# Altium footprint library HDMI Connectors.PcbLib: 3 footprints
Each footprint in its own frame and in the unit in brackets; x right, y up, seen from the top. Pads: shape width x height; smd on the part's side, far side on the other; paste and mask are expansions set on the pad; w line width, h text height; cw(c..) or ccw(c..) is an arc to the next point about the centre after c.
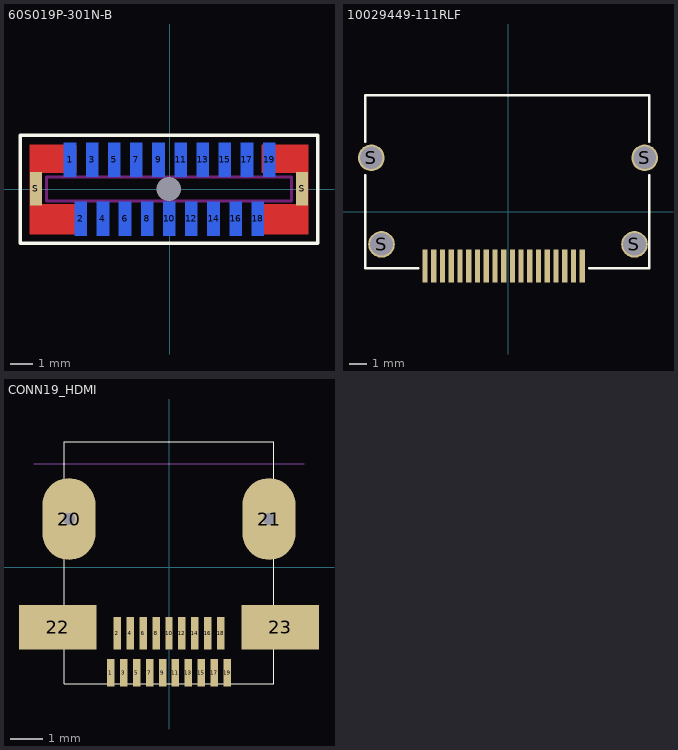
[diagram p0: the footprints below, top view; thin cyan lines are the x and y axes]

## 60S019P-301N-B [mm]
pads (22):
  rect 0x0 hole 1.1 square unplated: 0(-0.034,0.013)
  rect 0.55x1.524 smd far side: 1(-4.5,1.336) 2(-4.013,-1.336) 3(-3.5,1.336) 4(-3.013,-1.336) 5(-2.5,1.336) 6(-2.013,-1.336) 7(-1.5,1.336) 8(-1.013,-1.336) 9(-0.5,1.336) 10(-0.013,-1.336) 11(0.5,1.336) 12(0.987,-1.336) 13(1.5,1.336) 14(1.987,-1.336) 15(2.5,1.336) 16(2.987,-1.336) 17(3.5,1.336) 18(3.987,-1.336) 19(4.5,1.336)
  rect 0.55x1.524 smd: S(-6.045,0.025) S(5.994,0.025)
Top Layer:
  region: -4.216,0.737 -4.216,2.007 -6.325,2.007 -6.325,-2.032 -4.216,-2.032 -4.216,-0.686 -5.817,-0.686 -5.817,0.737
  region: 4.166,0.737 4.166,2.007 6.274,2.007 6.274,-2.032 4.166,-2.032 4.166,-0.686 5.766,-0.686 5.766,0.737
Top Overlay:
  lines w0.15: -6.756,-2.438 -5.512,-2.438 -4.318,-2.438 6.706,-2.438 6.706,-2.159 6.706,2.438 -4.851,2.438 -5.639,2.438 -6.756,2.438 -6.756,-2.438
Bottom Overlay:
  lines w0.15: -6.756,-2.438 6.706,-2.438 6.706,2.438 -6.756,2.438 -6.756,-2.438
Keep-Out Layer:
  lines w0.15: -5.563,-0.533 5.512,-0.533 5.512,0.559 -5.563,0.559 -5.563,-0.533
3D body "60S019P-301N-B.step": height 12.16, standoff -2.99, extent -5.534,-2.012 5.466,1.988

## 10029449-111RLF [mm] "CONN RCPT 1.4 HDMI 19POS SMD R/A"
pads (23):
  rect 0.3x1.9 smd: 1(-4.75,-3.099) 2(-4.25,-3.099) 3(-3.75,-3.099) 4(-3.25,-3.099) 5(-2.75,-3.099) 6(-2.25,-3.099) 7(-1.75,-3.099) 8(-1.25,-3.099) 9(-0.75,-3.099) 10(-0.25,-3.099) 11(0.25,-3.099) 12(0.75,-3.099) 13(1.25,-3.099) 14(1.75,-3.099) 15(2.25,-3.099) 16(2.75,-3.099) 17(3.25,-3.099) 18(3.75,-3.099) 19(4.25,-3.099)
  round 1.524 hole 1.3: S(-7.823,3.099) S(-7.239,-1.854) S(7.239,-1.854) S(7.823,3.099)
Top Overlay:
  lines w0.15: -8.179,2.108 -8.179,-3.226 -5.131,-3.226 ; -8.179,4.013 -8.179,6.68 8.077,6.68 8.077,4.013 ; 4.648,-3.226 8.077,-3.226 8.077,2.108
3D body "10029449-001LF.step": height 6.11, standoff -1.89, extent -8.102,-3.226 8.098,6.674

## CONN19_HDMI [mm] "CONN19_HDMI"
pads (23):
  rect 0.23x0.85 smd mask+0.051: 1(-1.8,-3.265) 3(-1.4,-3.265) 5(-1,-3.265) 7(-0.6,-3.265) 9(-0.2,-3.265) 11(0.2,-3.265) 13(0.6,-3.265) 15(1,-3.265) 17(1.4,-3.265) 19(1.8,-3.265)
  rect 0.23x1 smd mask+0.051: 2(-1.6,-2.04) 4(-1.2,-2.04) 6(-0.8,-2.04) 8(-0.4,-2.04) 10(0,-2.04) 12(0.4,-2.04) 14(0.8,-2.04) 16(1.2,-2.04) 18(1.6,-2.04)
  oval 1.651x2.54 hole 0.381 mask+0.051: 20(-3.1,1.5) 21(3.1,1.5)
  rect 2.4x1.38 smd mask+0.051: 22(-3.45,-1.86) 23(3.45,-1.86)
Top Overlay:
  lines w0.025: -3.25,-3.6 -3.25,3.9 3.25,3.9 3.25,-3.6 -3.25,-3.6
Mechanical 3:
  lines w0.025: -4.2,3.21 4.2,3.21
3D body "10118241-001RLF.step": height 3.05, standoff -0.48, extent -4.45,-3.625 4.45,3.875